# Altium footprint library CH3.96.PcbLib: 24 footprints (part 1 of 2)
Each footprint in its own frame and in the unit in brackets; x right, y up, seen from the top. Pads: shape width x height; smd on the part's side, far side on the other; paste and mask are expansions set on the pad; w line width, h text height; cw(c..) or ccw(c..) is an arc to the next point about the centre after c.
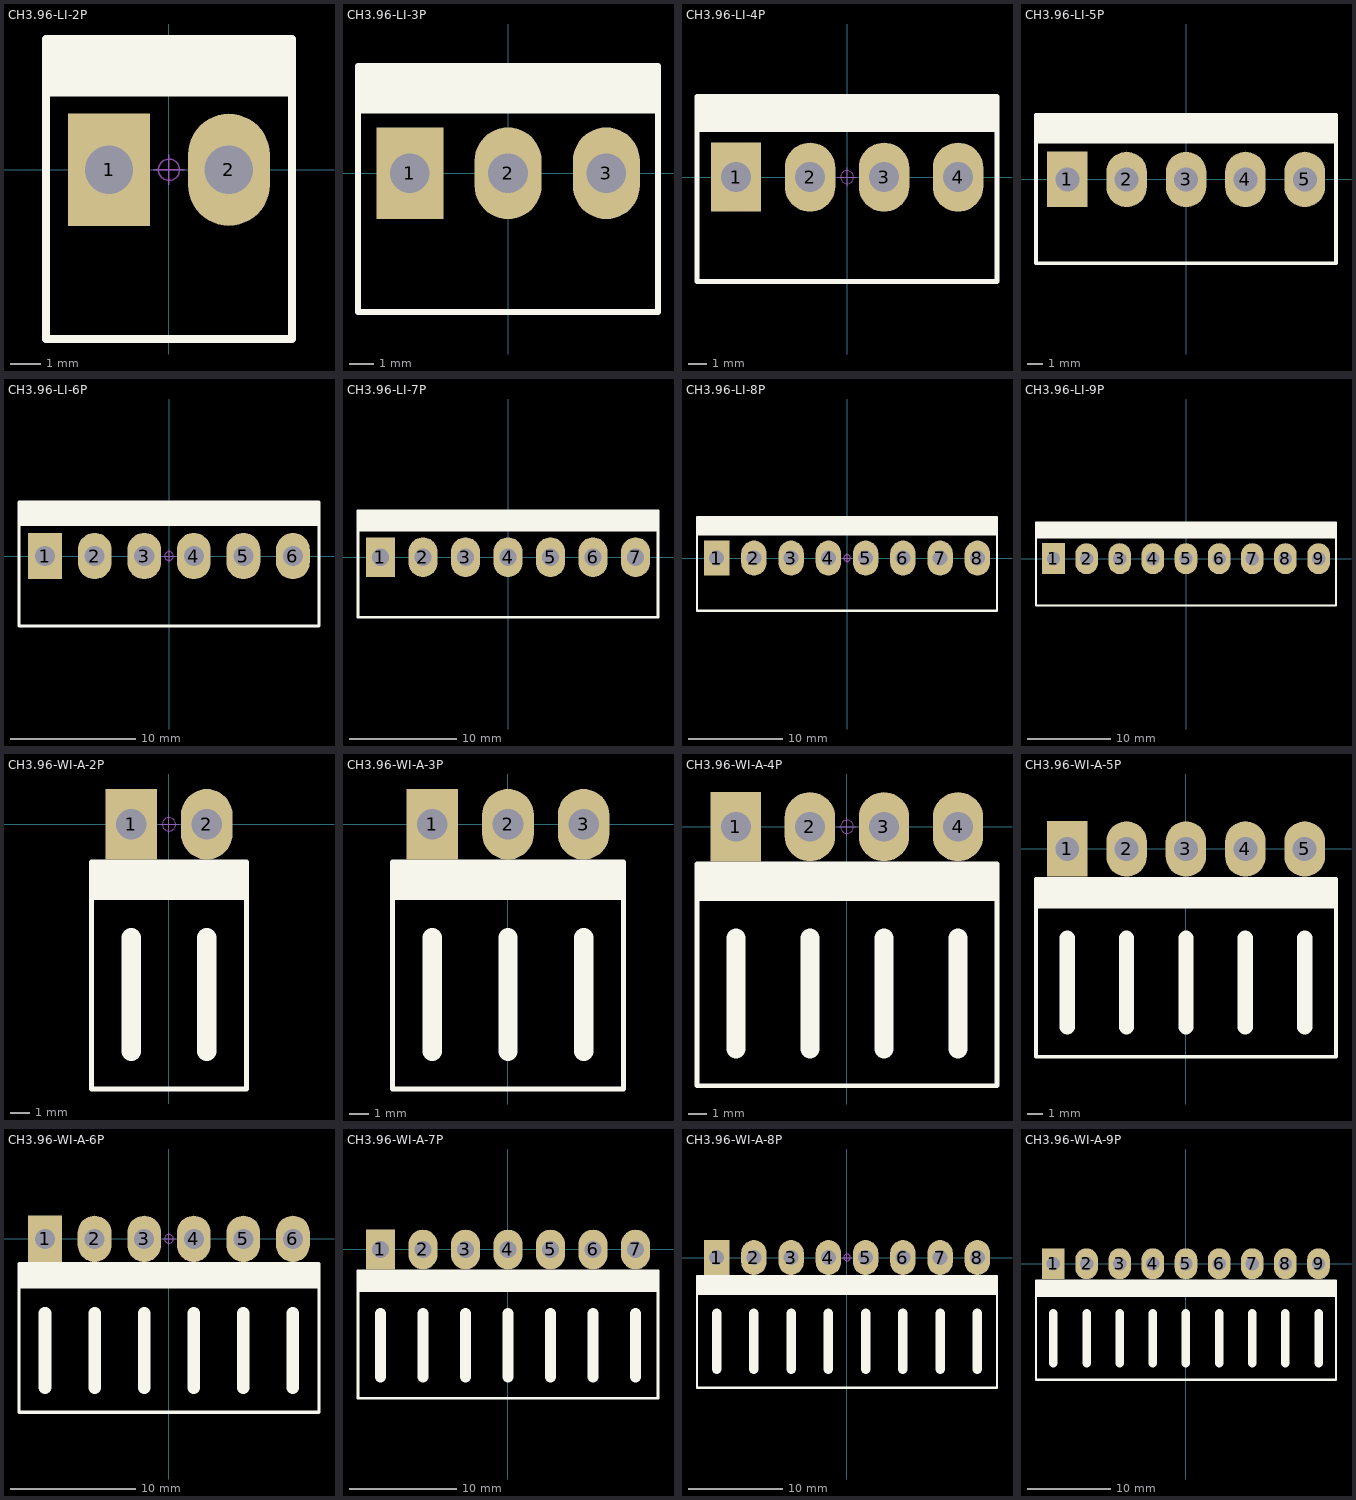
[diagram p0: the footprints below, top view; thin cyan lines are the x and y axes]

## CH3.96-LI-2P [mm] "直插，脚距：3.96"
pads (2):
  rect 2.7x3.7 hole 1.6: 1(-1.98,0)
  oval 2.7x3.7 hole 1.6: 2(1.98,0)
Top Overlay:
  rectangle: -4.064,2.54 4.065,4.318
  lines w0.254: -4.064,2.54 4.065,2.54 ; -4.064,-5.588 4.065,-5.588 4.064,4.318 -4.064,4.318 -4.064,-5.588
Mechanical 15:
  circle w0.05: c0,0 r0.35
  lines w0.05: -0.5,0 0.5,0 ; 0,-0.5 0,0.5
3D body: height 13.35, standoff -3.55, extent -3.96,-5.5 3.96,4.2

## CH3.96-LI-3P [mm] "直插，脚距：3.96"
pads (3):
  rect 2.7x3.7 hole 1.6: 1(-3.96,0)
  oval 2.7x3.7 hole 1.6: 2(0,0) 3(3.96,0)
Top Overlay:
  rectangle: -6.046,2.54 5.94,4.318
  lines w0.254: -6.046,2.54 5.94,2.54 ; -6.046,-5.588 6.043,-5.588 6.042,4.318 -6.046,4.318 -6.046,-5.588
Mechanical 15:
  circle w0.05: c0,0 r0.35
  lines w0.05: -0.5,0 0.5,0 ; 0,-0.5 0,0.5
3D body: height 13.35, standoff -3.55, extent -5.94,-5.5 5.94,4.2

## CH3.96-LI-4P [mm] "直插，脚距：3.96"
pads (4):
  rect 2.7x3.7 hole 1.6: 1(-5.94,0)
  oval 2.7x3.7 hole 1.6: 2(-1.98,0) 3(1.98,0) 4(5.94,0)
Top Overlay:
  rectangle: -8.026,2.54 7.92,4.318
  lines w0.254: -8.026,2.54 7.92,2.54 ; 7.92,-5.588 -8.026,-5.588 -8.026,4.318 8.022,4.318 8.023,-5.588
Mechanical 15:
  circle w0.05: c0,0 r0.35
  lines w0.05: -0.5,0 0.5,0 ; 0,-0.5 0,0.5
3D body: height 13.35, standoff -3.55, extent -7.92,-5.5 7.92,4.2

## CH3.96-LI-5P [mm] "直插，脚距：3.96"
pads (5):
  rect 2.7x3.7 hole 1.6: 1(-7.92,0)
  oval 2.7x3.7 hole 1.6: 2(-3.96,0) 3(0,0) 4(3.96,0) 5(7.92,0)
Top Overlay:
  rectangle: -10.006,2.54 9.9,4.318
  lines w0.254: -10.006,2.54 9.9,2.54 ; -10.006,-5.588 10.003,-5.588 10.002,4.318 -10.006,4.318 -10.006,-5.588
Mechanical 15:
  circle w0.05: c0,0 r0.35
  lines w0.05: -0.5,0 0.5,0 ; 0,-0.5 0,0.5
3D body: height 13.35, standoff -3.55, extent -9.9,-5.5 9.9,4.2

## CH3.96-LI-6P [mm] "直插，脚距：3.96"
pads (6):
  rect 2.7x3.7 hole 1.6: 1(-9.9,0)
  oval 2.7x3.7 hole 1.6: 2(-5.94,0) 3(-1.98,0) 4(1.98,0) 5(5.94,0) 6(9.9,0)
Top Overlay:
  rectangle: -11.986,2.54 11.88,4.318
  lines w0.254: -11.986,2.54 11.88,2.54 ; 11.88,4.318 -11.986,4.318 -11.986,-5.588 11.983,-5.588 11.982,4.318
Mechanical 15:
  circle w0.05: c0,0 r0.35
  lines w0.05: -0.5,0 0.5,0 ; 0,-0.5 0,0.5
3D body: height 13.35, standoff -3.55, extent -11.88,-5.5 11.88,4.2

## CH3.96-LI-7P [mm] "直插，脚距：3.96"
pads (7):
  rect 2.7x3.7 hole 1.6: 1(-11.88,0)
  oval 2.7x3.7 hole 1.6: 2(-7.92,0) 3(-3.96,0) 4(0,0) 5(3.96,0) 6(7.92,0) 7(11.88,0)
Top Overlay:
  rectangle: -13.966,2.54 13.86,4.318
  lines w0.254: -13.966,2.54 13.86,2.54 ; -13.966,-5.588 13.963,-5.588 13.962,4.318 -13.966,4.318 -13.966,-5.588
Mechanical 15:
  circle w0.05: c0,0 r0.35
  lines w0.05: -0.5,0 0.5,0 ; 0,-0.5 0,0.5
3D body: height 13.35, standoff -3.55, extent -13.86,-5.5 13.86,4.2

## CH3.96-LI-8P [mm] "直插，脚距：3.96"
pads (8):
  rect 2.7x3.7 hole 1.6: 1(-13.86,0)
  oval 2.7x3.7 hole 1.6: 2(-9.9,0) 3(-5.94,0) 4(-1.98,0) 5(1.98,0) 6(5.94,0) 7(9.9,0) 8(13.86,0)
Top Overlay:
  rectangle: -15.946,2.54 15.84,4.318
  lines w0.254: -15.946,2.54 15.84,2.54 ; -15.946,-5.588 15.943,-5.588 15.942,4.318 -15.946,4.318 -15.946,-5.588
Mechanical 15:
  circle w0.05: c0,0 r0.35
  lines w0.05: -0.5,0 0.5,0 ; 0,-0.5 0,0.5
3D body: height 13.35, standoff -3.55, extent -15.84,-5.5 15.84,4.2

## CH3.96-LI-9P [mm] "直插，脚距：3.96"
pads (9):
  rect 2.7x3.7 hole 1.6: 1(-15.84,0)
  oval 2.7x3.7 hole 1.6: 2(-11.88,0) 3(-7.92,0) 4(-3.96,0) 5(0,0) 6(3.96,0) 7(7.92,0) 8(11.88,0) 9(15.84,0)
Top Overlay:
  rectangle: -17.926,2.54 17.82,4.318
  lines w0.254: -17.926,2.54 17.82,2.54 ; -17.926,-5.588 -17.926,4.318 17.922,4.318 17.923,-5.588 -17.926,-5.588
Mechanical 15:
  circle w0.05: c0,0 r0.35
  lines w0.05: -0.5,0 0.5,0 ; 0,-0.5 0,0.5
3D body: height 13.35, standoff -3.55, extent -17.82,-5.5 17.82,4.2

## CH3.96-WI-A-2P [mm] "卧插，脚距：3.96"
pads (2):
  rect 2.7x3.7 hole 1.6: 1(-1.98,0)
  oval 2.7x3.7 hole 1.6: 2(1.98,0)
Top Overlay:
  rectangle: -4.064,-3.96 4.065,-1.98
  lines w0.254: -4.064,-13.86 4.066,-13.86 4.065,-1.98 -4.064,-1.98 -4.064,-13.86
  lines w1.016: -1.98,-11.88 -1.98,-5.94 ; 1.98,-11.88 1.98,-5.94
Mechanical 15:
  circle w0.05: c0,0 r0.35
  lines w0.05: -0.5,0 0.5,0 ; 0,-0.5 0,0.5
3D body: height 9.75, standoff -3.45, extent -3.96,-13.5 3.96,0.6

## CH3.96-WI-A-3P [mm] "卧插，脚距：3.96"
pads (3):
  rect 2.7x3.7 hole 1.6: 1(-3.96,0)
  oval 2.7x3.7 hole 1.6: 2(0.002,0) 3(3.96,0)
Top Overlay:
  rectangle: -6.044,-3.96 5.94,-1.98
  lines w0.254: 5.94,-13.86 -6.044,-13.86 -6.044,-1.98 6.045,-1.98 6.046,-13.86
  lines w1.016: -3.96,-11.88 -3.96,-5.94 ; 0,-11.88 0,-5.94 ; 3.96,-11.88 3.96,-5.94
Mechanical 15:
  circle w0.05: c0,0 r0.35
  lines w0.05: -0.5,0 0.5,0 ; 0,-0.5 0,0.5
3D body: height 9.75, standoff -3.45, extent -5.94,-13.5 5.94,0.6

## CH3.96-WI-A-4P [mm] "卧插，脚距：3.96"
pads (4):
  rect 2.7x3.7 hole 1.6: 1(-5.94,0)
  oval 2.7x3.7 hole 1.6: 2(-1.98,0) 3(1.98,0) 4(5.94,0)
Top Overlay:
  rectangle: -8.024,-3.96 7.92,-1.98
  lines w0.254: 7.92,-13.86 -8.024,-13.86 -8.024,-1.98 8.025,-1.98 8.026,-13.86
  lines w1.016: -5.94,-11.88 -5.94,-5.94 ; -1.98,-11.88 -1.98,-5.94 ; 1.98,-11.88 1.98,-5.94 ; 5.94,-11.88 5.94,-5.94
Mechanical 15:
  circle w0.05: c0,0 r0.35
  lines w0.05: -0.5,0 0.5,0 ; 0,-0.5 0,0.5
3D body: height 9.75, standoff -3.45, extent -7.92,-13.5 7.92,0.6

## CH3.96-WI-A-5P [mm] "卧插，脚距：3.96"
pads (5):
  rect 2.7x3.7 hole 1.6: 1(-7.92,0)
  oval 2.7x3.7 hole 1.6: 2(-3.96,0) 3(0,0) 4(3.96,0) 5(7.92,0)
Top Overlay:
  rectangle: -10.004,-3.96 9.9,-1.98
  lines w0.254: 9.9,-13.86 -10.004,-13.86 -10.004,-1.98 10.005,-1.98 10.006,-13.86
  lines w1.016: -7.92,-11.88 -7.92,-5.94 ; -3.96,-11.88 -3.96,-5.94 ; 0,-11.88 0,-5.94 ; 3.96,-11.88 3.96,-5.94 ; 7.92,-11.88 7.92,-5.94
Mechanical 15:
  circle w0.05: c0,0 r0.35
  lines w0.05: -0.5,0 0.5,0 ; 0,-0.5 0,0.5
3D body: height 9.75, standoff -3.45, extent -9.9,-13.5 9.9,0.6

## CH3.96-WI-A-6P [mm] "卧插，脚距：3.96"
pads (6):
  rect 2.7x3.7 hole 1.6: 1(-9.9,0)
  oval 2.7x3.7 hole 1.6: 2(-5.94,0) 3(-1.98,0) 4(1.98,0) 5(5.94,0) 6(9.9,0)
Top Overlay:
  rectangle: -11.984,-3.96 11.88,-1.98
  lines w0.254: -11.984,-13.86 11.986,-13.86 11.985,-1.98 -11.984,-1.98 -11.984,-13.86
  lines w1.016: -9.9,-11.88 -9.9,-5.94 ; -5.94,-11.88 -5.94,-5.94 ; -1.98,-11.88 -1.98,-5.94 ; 1.98,-11.88 1.98,-5.94 ; 5.94,-11.88 5.94,-5.94 ; 9.9,-11.88 9.9,-5.94
Mechanical 15:
  circle w0.05: c0,0 r0.35
  lines w0.05: -0.5,0 0.5,0 ; 0,-0.5 0,0.5
3D body: height 9.75, standoff -3.45, extent -11.88,-13.5 11.88,0.6

## CH3.96-WI-A-7P [mm] "卧插，脚距：3.96"
pads (7):
  rect 2.7x3.7 hole 1.6: 1(-11.88,0)
  oval 2.7x3.7 hole 1.6: 2(-7.92,0) 3(-3.96,0) 4(0,0) 5(3.96,0) 6(7.92,0) 7(11.88,0)
Top Overlay:
  rectangle: -13.964,-3.96 13.86,-1.98
  lines w0.254: -13.964,-13.86 -13.964,-1.98 13.965,-1.98 13.966,-13.86 -13.964,-13.86
  lines w1.016: -11.88,-11.88 -11.88,-5.94 ; -7.92,-11.88 -7.92,-5.94 ; -3.96,-11.88 -3.96,-5.94 ; 0,-11.88 0,-5.94 ; 3.96,-11.88 3.96,-5.94 ; 7.92,-11.88 7.92,-5.94 ; 11.88,-11.88 11.88,-5.94
Mechanical 15:
  circle w0.05: c0,0 r0.35
  lines w0.05: -0.5,0 0.5,0 ; 0,-0.5 0,0.5
3D body: height 9.75, standoff -3.45, extent -13.86,-13.5 13.86,0.6

## CH3.96-WI-A-8P [mm] "卧插，脚距：3.96"
pads (8):
  rect 2.7x3.7 hole 1.6: 1(-13.86,0)
  oval 2.7x3.7 hole 1.6: 2(-9.9,0) 3(-5.94,0) 4(-1.98,0) 5(1.98,0) 6(5.94,0) 7(9.9,0) 8(13.86,0)
Top Overlay:
  rectangle: -15.944,-3.96 15.84,-1.98
  lines w0.254: 15.84,-1.98 -15.944,-1.98 -15.944,-13.86 15.946,-13.86 15.945,-1.98
  lines w1.016: -13.86,-11.88 -13.86,-5.94 ; -9.9,-11.88 -9.9,-5.94 ; -5.94,-11.88 -5.94,-5.94 ; -1.98,-11.88 -1.98,-5.94 ; 1.98,-11.88 1.98,-5.94 ; 5.94,-11.88 5.94,-5.94 ; 9.9,-11.88 9.9,-5.94 ; 13.86,-11.88 13.86,-5.94
Mechanical 15:
  circle w0.05: c0,0 r0.35
  lines w0.05: -0.5,0 0.5,0 ; 0,-0.5 0,0.5
3D body: height 9.75, standoff -3.45, extent -15.84,-13.5 15.84,0.6

## CH3.96-WI-A-9P [mm] "卧插，脚距：3.96"
pads (9):
  rect 2.7x3.7 hole 1.6: 1(-15.84,0)
  oval 2.7x3.7 hole 1.6: 2(-11.88,0) 3(-7.92,0) 4(-3.96,0) 5(0,0) 6(3.96,0) 7(7.92,0) 8(11.88,0) 9(15.84,0)
Top Overlay:
  rectangle: -17.924,-3.96 17.82,-1.98
  lines w0.254: 17.82,-1.98 -17.924,-1.98 -17.924,-13.86 17.926,-13.86 17.925,-1.98
  lines w1.016: -15.84,-11.88 -15.84,-5.94 ; -11.88,-11.88 -11.88,-5.94 ; -7.92,-11.88 -7.92,-5.94 ; -3.96,-11.88 -3.96,-5.94 ; 0,-11.88 0,-5.94 ; 3.96,-11.88 3.96,-5.94 ; 7.92,-11.88 7.92,-5.94 ; 11.88,-11.88 11.88,-5.94 ; 15.84,-11.88 15.84,-5.94
Mechanical 15:
  circle w0.05: c0,0 r0.35
  lines w0.05: -0.5,0 0.5,0 ; 0,-0.5 0,0.5
3D body: height 9.75, standoff -3.45, extent -17.82,-13.5 17.82,0.6